# Altium footprint library footprints.PcbLib: 26 footprints (part 1 of 2)
Each footprint in its own frame and in the unit in brackets; x right, y up, seen from the top. Pads: shape width x height; smd on the part's side, far side on the other; paste and mask are expansions set on the pad; w line width, h text height; cw(c..) or ccw(c..) is an arc to the next point about the centre after c.
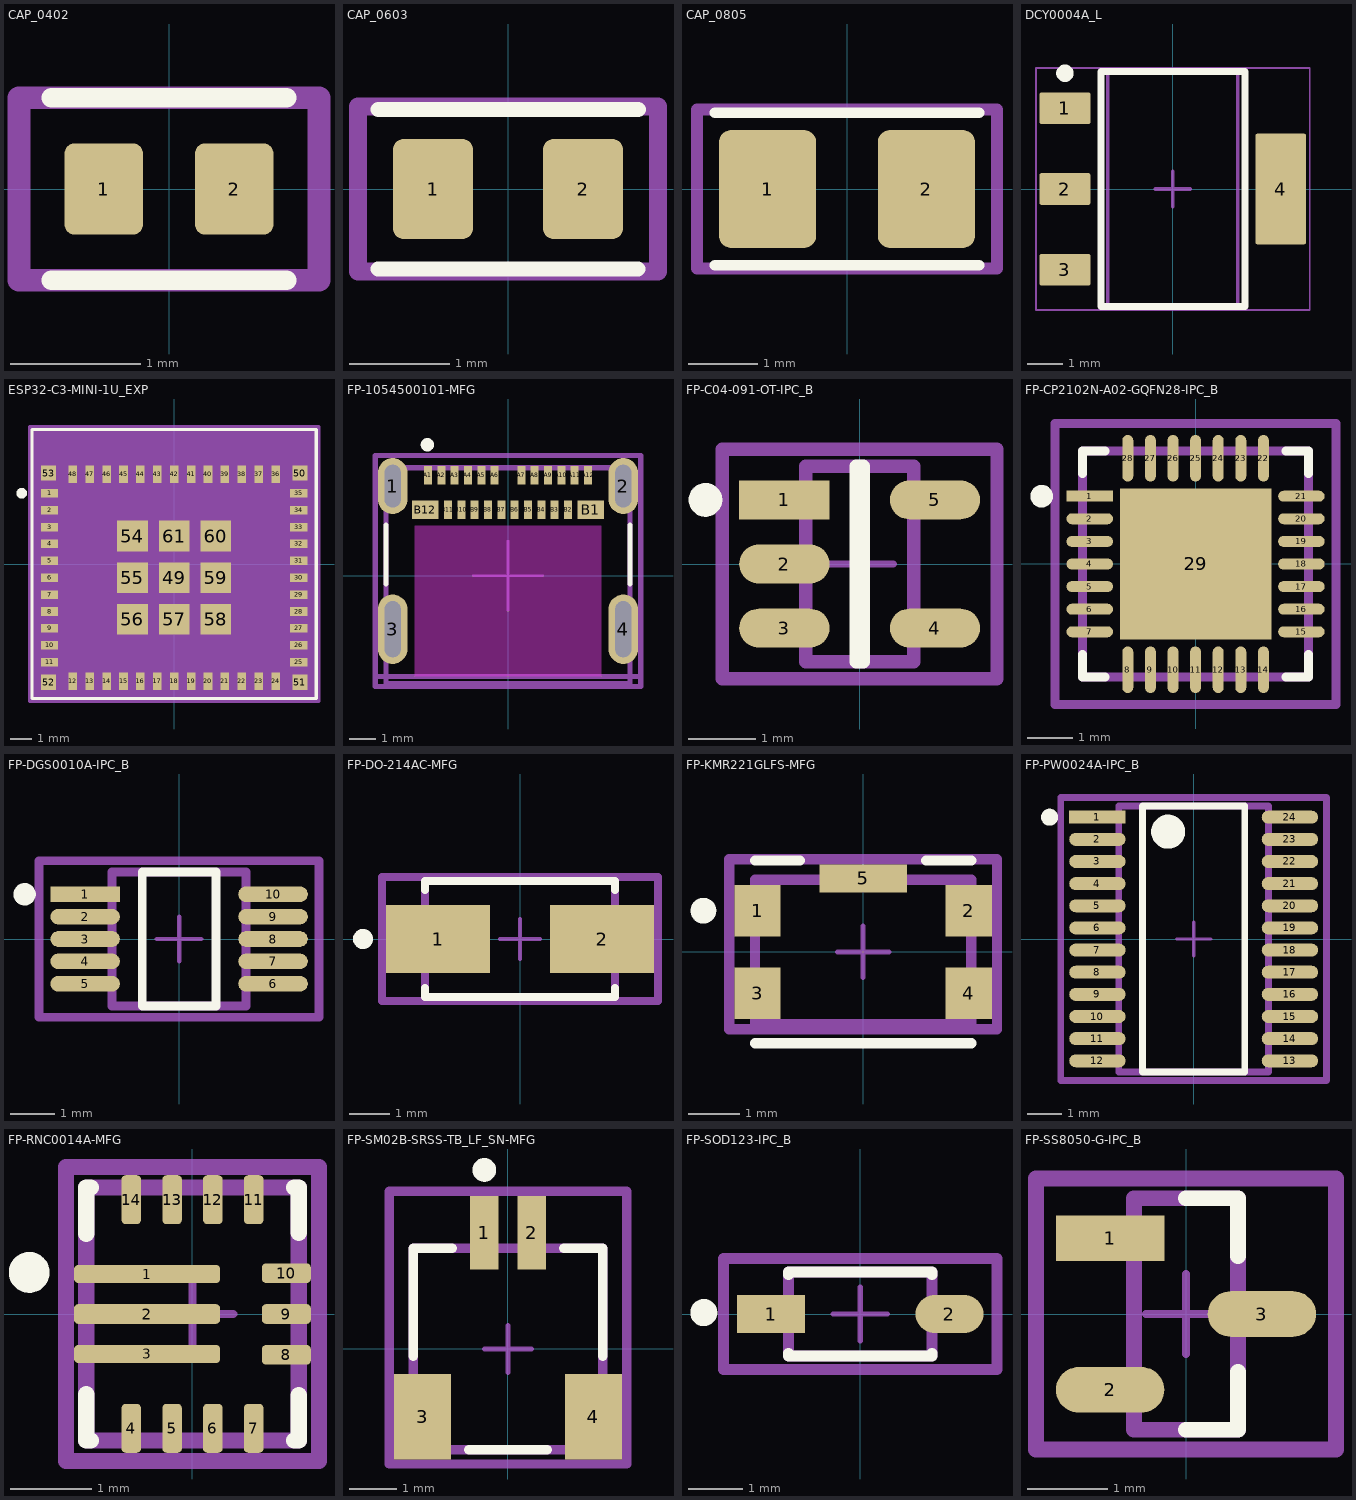
[diagram p0: the footprints below, top view; thin cyan lines are the x and y axes]

## CAP_0402 [mm]
pads (2):
  rrect25% 0.6x0.7 smd: 1(-0.5,0) 2(0.5,0)
Top Overlay:
  lines w0.152: -0.9,-0.7 0.9,-0.7 ; -0.9,0.7 0.9,0.7
Mechanical 13:
  lines w0.175: -1.15,-0.7 -1.15,0.7 1.15,0.7 1.15,-0.7 -1.15,-0.7
3D body "C0402.step": height 0.37, standoff 0.01, extent -0.5,-0.265 0.5,0.265

## CAP_0603 [mm]
pads (2):
  rrect25% 0.8x1 smd: 1(-0.75,0) 2(0.75,0)
Top Overlay:
  lines w0.152: -1.3,-0.8 1.3,-0.8 ; -1.298,0.795 1.302,0.795
Mechanical 13:
  lines w0.175: -1.5,-0.825 1.5,-0.825 1.5,0.825 -1.5,0.825 -1.5,-0.825
3D body "C0603.step": height 0.51, standoff 0.01, extent -0.8,-0.4 0.8,0.4

## CAP_0805 [mm]
pads (2):
  rrect25% 1.4x1.7 smd: 1(-1.143,0) 2(1.143,0)
Top Overlay:
  lines w0.152: -1.9,-1.1 1.9,-1.1 ; -1.9,1.1 1.9,1.1
Mechanical 13:
  lines w0.175: -2.159,-1.143 -2.159,1.143 2.159,1.143 2.159,-1.143 -2.159,-1.143
3D body "C0805.stp": height 1.01, standoff 0.01, extent -1.15,-0.762 1.15,0.788

## DCY0004A_L [mm] "SOT223, 4-Leads, Body 6.7x3.7mm, Pitch 2.3mm, IPC High Density"
height 1.8
pads (4):
  rrect11% 1.45x0.9 smd: 1(-3.075,2.3) 2(-3.075,0) 3(-3.075,-2.3)
  rrect7% 1.45x3.15 smd: 4(3.075,0)
Top Overlay:
  circle w0.25: c-3.075,3.3 r0.125
  lines w0.2: -2.05,-3.35 -2.05,3.35 2.05,3.35 2.05,-3.35 -2.05,-3.35
Mechanical 1:
  text ".Designator" at -1.651,-0.381 h0.8
Mechanical 13:
  lines w0.1: -1.85,-3.35 -1.85,3.35 1.85,3.35 1.85,-3.35 -1.85,-3.35
Mechanical 15:
  lines w0.05: -3.9,-3.45 -3.9,3.45 3.9,3.45 3.9,-3.45 -3.9,-3.45
  lines w0.1: -0.5,0 0.5,0 ; 0,-0.5 0,0.5
3D body "SOT-223.stp": height 1.62, standoff -0.03, extent -3.5,-3.25 3.5,3.25

## ESP32-C3-MINI-1U_EXP [mil]
pads (61):
  rect 32x16 smd paste+0 mask+0: 1(-232.28,131.89) 2(-232.28,100.39) 3(-232.28,68.9) 4(-232.28,37.4) 5(-232.28,5.91) 6(-232.28,-25.59) 7(-232.28,-57.09) 8(-232.28,-88.58) 9(-232.28,-120.08) 10(-232.28,-151.57) 11(-232.28,-183.07) 25(232.28,-183.07) 26(232.28,-151.57) 27(232.28,-120.08) 28(232.28,-88.58) 29(232.28,-57.09) 30(232.28,-25.59) 31(232.28,5.91) 32(232.28,37.4) 33(232.28,68.9) 34(232.28,100.39) 35(232.28,131.89)
  rect 16x32 smd paste+0 mask+0: 12(-188.98,-218.5) 13(-157.48,-218.5) 14(-125.98,-218.5) 15(-94.49,-218.5) 16(-62.99,-218.5) 17(-31.5,-218.5) 18(0,-218.5) 19(31.5,-218.5) 20(62.99,-218.5) 21(94.49,-218.5) 22(125.98,-218.5) 23(157.48,-218.5) 24(188.98,-218.5) 36(188.98,167.32) 37(157.48,167.32) 38(125.98,167.32) 39(94.49,167.32) 40(62.99,167.32) 41(31.5,167.32) 42(0,167.32) 43(-31.5,167.32) 44(-62.99,167.32) 45(-94.49,167.32) 46(-125.98,167.32) 47(-157.48,167.32) 48(-188.98,167.32)
  rect 57x57 smd paste+0 mask+0: 49(0,-25.59) 54(-77.76,52.17) 55(-77.76,-25.59) 56(-77.76,-103.35) 57(0,-103.35) 58(77.76,-103.35) 59(77.76,-25.59) 60(77.76,52.17) 61(0,52.17)
  rect 28x28 smd paste+0 mask+0: 50(234.25,169.29) 51(234.25,-220.47) 52(-234.25,-220.47) 53(-234.25,169.29)
Top Overlay:
  circle w9.84: c-284.45,131.89 r4.92
  lines w6: -265,-251 -265,251 265,251 265,-251 -265,-251
Mechanical 13:
  lines w1: -260,196 -210,246 ; -260,-246 -260,246 260,246 260,-246 -260,-246
  text "*" at -203.78,106.89 h50
Mechanical 15:
  region: 270,256 -270,256 -270,-256 270,-256
  lines w6: -270,-256 270,-256 270,256 -270,256 -270,-256
3D body "ESP32-C3-MINI-1U 3D Model.STEP": height 94.49, standoff 0, extent -260,-246 259.69,246.13

## FP-1054500101-MFG [mm]
pads (28):
  rrect100% 1.1x2.1 hole 1.6 slot 0.6 at 0 deg paste-2539.97 mask+0: 1(-4.32,3.36) 2(4.32,3.36)
  rrect100% 1.1x2.6 hole 2.1 slot 0.6 at 0 deg paste-2539.97 mask+0: 3(-4.32,-2) 4(4.32,-2)
  rect 0.3x0.7 smd paste+0 mask+0: A1(-3,3.77) A2(-2.5,3.77) A3(-2,3.77) A4(-1.5,3.77) A5(-1,3.77) A6(-0.5,3.77) A7(0.5,3.77) A8(1,3.77) A9(1.5,3.77) A10(2,3.77) A11(2.5,3.77) A12(3,3.77) B2(2.25,2.47) B3(1.75,2.47) B4(1.25,2.47) B5(0.75,2.47) B6(0.25,2.47) B7(-0.25,2.47) B8(-0.75,2.47) B9(-1.25,2.47) B10(-1.75,2.47) B11(-2.25,2.47)
  rect 1x0.7 smd paste+0 mask+0: B1(3.1,2.47) B12(-3.1,2.47)
Top Overlay:
  circle w0.25: c-3.02,4.91 r0.125
  lines w0.2: -4.57,-0.3 -4.57,1.9 ; 4.57,-0.3 4.57,1.9
Keep-Out Layer:
  rectangle: -3.5,-3.77 3.5,1.88
Top 3D Body:
  lines w0.2: -4.97,-3.77 4.97,-3.77 ; -4.57,-4.05 4.57,-4.05 4.57,4.05 -4.57,4.05 -4.57,-4.05
Top Assembly:
  lines w0.2: -4.97,-4.15 4.97,-4.15 4.97,4.51 -4.97,4.51 -4.97,-4.15
  text ".Designator" at 0,0.368 h1
Top Courtyard:
  lines w0.2: -4.97,-4.15 4.97,-4.15 4.97,4.51 -4.97,4.51 -4.97,-4.15
Top Component Center:
  lines w0.1: -1.299,0 1.299,0 ; 0,-1.299 0,1.299
3D body "105450-0101.stp": height 3.17, standoff -0.79, extent -4.47,-3.938 4.47,3.962

## FP-C04-091-OT-IPC_B [mm]
pads (5):
  rect 1.338x0.578 smd paste+0 mask+0: 1(-1.116,0.95)
  rrect100% 1.338x0.578 smd paste+0 mask+0: 2(-1.116,0) 3(-1.116,-0.95) 4(1.116,-0.95) 5(1.116,0.95)
Top Overlay:
  circle w0.25: c-2.285,0.95 r0.125
  lines w0.2: -0.053,-1.45 0.053,-1.45 0.053,1.45 -0.053,1.45 -0.053,-1.45
Top 3D Body:
  lines w0.2: -0.8,-1.45 -0.8,1.45 0.8,1.45 0.8,-1.45 -0.8,-1.45
Top Assembly:
  lines w0.2: -2.035,-1.7 -2.035,1.7 2.035,1.7 2.035,-1.7 -2.035,-1.7
  text ".Designator" at 0,0.188 h1
Top Courtyard:
  lines w0.2: -2.035,-1.7 -2.035,1.7 2.035,1.7 2.035,-1.7 -2.035,-1.7
Top Component Center:
  lines w0.1: -0.5,0 0.5,0 ; 0,-0.5 0,0.5
3D body "MCP73831T-2ACI_OT.step": height 1.45, standoff 0, extent -1.35,-1.45 1.35,1.45

## FP-CP2102N-A02-GQFN28-IPC_B [mm]
pads (29):
  rect 1.031x0.242 smd paste+0 mask+0: 1(-2.341,1.5)
  rrect100% 1.031x0.242 smd paste+0 mask+0: 2(-2.341,1) 3(-2.341,0.5) 4(-2.341,0) 5(-2.341,-0.5) 6(-2.341,-1) 7(-2.341,-1.5) 15(2.341,-1.5) 16(2.341,-1) 17(2.341,-0.5) 18(2.341,0) 19(2.341,0.5) 20(2.341,1) 21(2.341,1.5)
  rrect100% 0.242x1.031 smd paste+0 mask+0: 8(-1.5,-2.341) 9(-1,-2.341) 10(-0.5,-2.341) 11(0,-2.341) 12(0.5,-2.341) 13(1,-2.341) 14(1.5,-2.341) 22(1.5,2.341) 23(1,2.341) 24(0.5,2.341) 25(0,2.341) 26(-0.5,2.341) 27(-1,2.341) 28(-1.5,2.341)
  rect 3.35x3.35 smd paste-1000 mask+0: 29(0,0)
Top Overlay:
  circle w0.25: c-3.406,1.5 r0.125
  lines w0.2: -2.5,-2 -2.5,-2.5 -2,-2.5 ; -2.5,2 -2.5,2.5 -2,2.5 ; 2,-2.5 2.5,-2.5 2.5,-2 ; 2,2.5 2.5,2.5 2.5,2
Top Paste:
  rectangle: -1.059,-1.059 1.059,1.059
Top 3D Body:
  lines w0.2: -2.5,-2.5 -2.5,2.5 2.5,2.5 2.5,-2.5 -2.5,-2.5
Top Assembly:
  lines w0.2: -3.106,-3.106 -3.106,3.106 3.106,3.106 3.106,-3.106 -3.106,-3.106
  text ".Designator" at 0,0.188 h1
Top Courtyard:
  lines w0.2: -3.106,-3.106 -3.106,3.106 3.106,3.106 3.106,-3.106 -3.106,-3.106
Top Component Center:
  lines w0.1: -0.5,0 0.5,0 ; 0,-0.5 0,0.5
3D body "IC_Silicon_Labs_CP2102N-A02-GQFN28_eec.STEP": height 0.25, standoff 0, extent -3.106,-3.106 3.106,3.106

## FP-DGS0010A-IPC_B [mm]
pads (10):
  rect 1.557x0.35 smd paste+0 mask+0: 1(-2.101,1)
  rrect100% 1.557x0.35 smd paste+0 mask+0: 2(-2.101,0.5) 3(-2.101,0) 4(-2.101,-0.5) 5(-2.101,-1) 6(2.101,-1) 7(2.101,-0.5) 8(2.101,0) 9(2.101,0.5) 10(2.101,1)
Top Overlay:
  circle w0.25: c-3.454,1 r0.125
  lines w0.2: -0.823,-1.5 -0.823,1.5 0.823,1.5 0.823,-1.5 -0.823,-1.5
Top 3D Body:
  lines w0.2: -1.5,-1.5 -1.5,1.5 1.5,1.5 1.5,-1.5 -1.5,-1.5
Top Assembly:
  lines w0.2: -3.129,-1.75 -3.129,1.75 3.129,1.75 3.129,-1.75 -3.129,-1.75
  text ".Designator" at 0,0.188 h1
Top Courtyard:
  lines w0.2: -3.129,-1.75 -3.129,1.75 3.129,1.75 3.129,-1.75 -3.129,-1.75
Top Component Center:
  lines w0.1: -0.5,0 0.5,0 ; 0,-0.5 0,0.5
3D body "IC_Texas_Instruments_TS5A23159DGSR_eec.STEP": height 1.1, standoff 0, extent -2.45,-1.5 2.45,1.5

## FP-DO-214AC-MFG [mm]
pads (2):
  rect 2.6x1.7 smd paste+0 mask+0: 1(-2.05,0) 2(2.05,0)
Top Overlay:
  circle w0.25: c-3.925,0 r0.125
  lines w0.2: -2.375,-1.225 -2.375,-1.45 2.375,-1.45 2.375,-1.225 ; -2.375,1.225 -2.375,1.45 2.375,1.45 2.375,1.225
Top 3D Body:
  lines w0.2: -2.375,-1.45 2.375,-1.45 2.375,1.45 -2.375,1.45 -2.375,-1.45
Top Assembly:
  lines w0.2: -3.45,-1.55 3.45,-1.55 3.45,1.55 -3.45,1.55 -3.45,-1.55
  text ".Designator" at 0,0.188 h1
Top Courtyard:
  lines w0.2: -3.45,-1.55 3.45,-1.55 3.45,1.55 -3.45,1.55 -3.45,-1.55
Top Component Center:
  lines w0.1: -0.5,0 0.5,0 ; 0,-0.5 0,0.5
3D body "Diode_Comchip_Technology_CDBA240LL-HF_eec.STEP": height 0.25, standoff 0, extent -3.45,-1.55 3.45,1.55

## FP-KMR221GLFS-MFG [mm]
pads (5):
  rect 0.9x1 smd paste+0 mask+0: 1(-2.05,0.8) 2(2.05,0.8) 3(-2.05,-0.8) 4(2.05,-0.8)
  rect 1.7x0.55 smd paste+0 mask+0: 5(0,1.425)
Top Overlay:
  circle w0.25: c-3.1,0.8 r0.125
  lines w0.2: -2.1,-1.775 2.1,-1.775 ; -2.1,1.775 -1.225,1.775 ; 1.225,1.775 2.1,1.775
Top 3D Body:
  lines w0.2: -2.1,-1.4 -2.1,1.4 2.1,1.4 2.1,-1.4 -2.1,-1.4
Top Assembly:
  lines w0.2: -2.6,-1.5 -2.6,1.8 2.6,1.8 2.6,-1.5 -2.6,-1.5
  text ".Designator" at 0,0.149 h1
Top Courtyard:
  lines w0.2: -2.6,-1.5 -2.6,1.8 2.6,1.8 2.6,-1.5 -2.6,-1.5
Top Component Center:
  lines w0.1: -0.5,0 0.5,0 ; 0,-0.5 0,0.5
3D body "Switch_C&K_KMR221GLFS_eec.STEP": height 0.25, standoff 0, extent -2.6,-1.5 2.6,1.8

## FP-PW0024A-IPC_B [mm]
pads (24):
  rect 1.655x0.381 smd paste+0 mask+0: 1(-2.825,3.575)
  rrect100% 1.655x0.381 smd paste+0 mask+0: 2(-2.825,2.925) 3(-2.825,2.275) 4(-2.825,1.625) 5(-2.825,0.975) 6(-2.825,0.325) 7(-2.825,-0.325) 8(-2.825,-0.975) 9(-2.825,-1.625) 10(-2.825,-2.275) 11(-2.825,-2.925) 12(-2.825,-3.575) 13(2.825,-3.575) 14(2.825,-2.925) 15(2.825,-2.275) 16(2.825,-1.625) 17(2.825,-0.975) 18(2.825,-0.325) 19(2.825,0.325) 20(2.825,0.975) 21(2.825,1.625) 22(2.825,2.275) 23(2.825,2.925) 24(2.825,3.575)
Top Overlay:
  circle w0.25: c-4.228,3.575 r0.125
  circle w0.5: c-0.748,3.15 r0.25
  lines w0.2: -1.498,-3.9 -1.498,3.9 1.498,3.9 1.498,-3.9 -1.498,-3.9
Top 3D Body:
  lines w0.2: -2.2,-3.9 -2.2,3.9 2.2,3.9 2.2,-3.9 -2.2,-3.9
Top Assembly:
  lines w0.2: -3.903,-4.15 -3.903,4.15 3.903,4.15 3.903,-4.15 -3.903,-4.15
  text ".Designator" at 0,0.188 h1
Top Courtyard:
  lines w0.2: -3.903,-4.15 -3.903,4.15 3.903,4.15 3.903,-4.15 -3.903,-4.15
Top Component Center:
  lines w0.1: -0.5,0 0.5,0 ; 0,-0.5 0,0.5
3D body "IC_Texas_Instruments_TCA9548APWR_eec.STEP": height 0.25, standoff 0, extent -3.903,-4.15 3.903,4.15

## FP-RNC0014A-MFG [mm]
pads (14):
  rrect45% 1.79x0.22 smd paste-1000 mask+0: 1(-0.555,0.49) 3(-0.555,-0.49)
  rrect42% 1.79x0.24 smd paste-1000 mask+0: 2(-0.555,0)
  rrect42% 0.24x0.6 smd paste+0 mask+0: 4(-0.75,-1.4) 5(-0.25,-1.4) 6(0.25,-1.4) 7(0.75,-1.4) 11(0.75,1.4) 12(0.25,1.4) 13(-0.25,1.4) 14(-0.75,1.4)
  rrect42% 0.6x0.24 smd paste+0 mask+0: 8(1.15,-0.5) 9(1.15,0) 10(1.15,0.5)
Top Overlay:
  circle w0.25: c-2,0.51 r0.125
  lines w0.2: -1.3,-0.985 -1.3,-1.55 -1.245,-1.55 ; -1.3,0.985 -1.3,1.55 -1.245,1.55 ; 1.245,-1.55 1.3,-1.55 1.3,-0.995 ; 1.245,1.55 1.3,1.55 1.3,0.995
Top Paste:
  drawing of 6 lines, arcs and shapes, not listed
Top 3D Body:
  lines w0.2: -1.3,-1.55 -1.3,1.55 1.3,1.55 1.3,-1.55 -1.3,-1.55
Top Assembly:
  lines w0.2: -1.55,-1.8 -1.55,1.8 1.55,1.8 1.55,-1.8 -1.55,-1.8
  text ".Designator" at 0,0.188 h1
Top Courtyard:
  lines w0.2: -1.55,-1.8 -1.55,1.8 1.55,1.8 1.55,-1.8 -1.55,-1.8
Top Component Center:
  lines w0.1: -0.5,0 0.5,0 ; 0,-0.5 0,0.5
3D body "IC_Texas_Instruments_TPS630250RNCR_eec.STEP": height 0.25, standoff 0, extent -1.55,-1.8 1.55,1.8

## FP-SM02B-SRSS-TB_LF_SN-MFG [mm]
pads (4):
  rect 0.6x1.55 smd paste+0 mask+0: 1(-0.5,2.45) 2(0.5,2.45)
  rect 1.2x1.8 smd paste+0 mask+0: 3(-1.8,-1.425) 4(1.8,-1.425)
Top Overlay:
  circle w0.25: c-0.5,3.775 r0.125
  lines w0.2: -2,-0.15 -2,2.125 -1.175,2.125 ; -0.825,-2.125 0.825,-2.125 ; 1.175,2.125 2,2.125 2,-0.15
Top 3D Body:
  lines w0.2: -2,-2.125 2,-2.125 2,2.125 -2,2.125 -2,-2.125
Top Assembly:
  lines w0.2: -2.5,-2.425 2.5,-2.425 2.5,3.325 -2.5,3.325 -2.5,-2.425
  text ".Designator" at 0,0.638 h1
Top Courtyard:
  lines w0.2: -2.5,-2.425 2.5,-2.425 2.5,3.325 -2.5,3.325 -2.5,-2.425
Top Component Center:
  lines w0.1: -0.5,0 0.5,0 ; 0,-0.5 0,0.5
3D body "Conn_JST_SM02B-SRSS-TB_LF_SN_eec.STEP": height 0.25, standoff 0, extent -2.5,-2.425 2.5,3.325

## FP-SOD123-IPC_B [mm]
pads (2):
  rect 1.257x0.702 smd paste+0 mask+0: 1(-1.65,0)
  rrect100% 1.257x0.702 smd paste+0 mask+0: 2(1.65,0)
Top Overlay:
  circle w0.25: c-2.895,0.026 r0.125
  lines w0.2: -1.325,-0.726 -1.325,-0.775 1.325,-0.775 1.325,-0.726 ; -1.325,0.726 -1.325,0.775 1.325,0.775 1.325,0.726
Top 3D Body:
  lines w0.2: -1.325,-0.775 -1.325,0.775 1.325,0.775 1.325,-0.775 -1.325,-0.775
Top Assembly:
  lines w0.2: -2.529,-1.025 -2.529,1.025 2.529,1.025 2.529,-1.025 -2.529,-1.025
  text ".Designator" at 0,0.188 h1
Top Courtyard:
  lines w0.2: -2.529,-1.025 -2.529,1.025 2.529,1.025 2.529,-1.025 -2.529,-1.025
Top Component Center:
  lines w0.1: -0.5,0 0.5,0 ; 0,-0.5 0,0.5
3D body "Diode_Diodes_Inc_MMSZ5245B-7-F_eec.STEP": height 0.25, standoff 0, extent -2.529,-1.025 2.529,1.025

## FP-SS8050-G-IPC_B [mm]
pads (3):
  rect 1.357x0.572 smd paste+0 mask+0: 1(-0.951,0.95)
  rrect100% 1.357x0.572 smd paste+0 mask+0: 2(-0.951,-0.95) 3(0.951,0)
Top Overlay:
  lines w0.2: 0,-1.45 0.65,-1.45 0.65,-0.725 ; 0,1.45 0.65,1.45 0.65,0.725
Top 3D Body:
  lines w0.2: -0.65,-1.45 0.65,-1.45 0.65,1.45 -0.65,1.45 -0.65,-1.45
Top Assembly:
  lines w0.2: -1.879,-1.7 1.879,-1.7 1.879,1.7 -1.879,1.7 -1.879,-1.7
  text ".Designator" at 0,-0.001 h1
Top Courtyard:
  lines w0.2: -1.879,-1.7 1.879,-1.7 1.879,1.7 -1.879,1.7 -1.879,-1.7
Top Component Center:
  lines w0.1: -0.5,0 0.5,0 ; 0,-0.5 0,0.5
3D body "Trans_Comchip_SS8050-G_eec.STEP": height 0.25, standoff 0, extent -1.879,-1.7 1.879,1.7